# Altium footprint library Design III PCB Library.PcbLib: 98 footprints (part 6 of 7)
Each footprint in its own frame and in the unit in brackets; x right, y up, seen from the top. Pads: shape width x height; smd on the part's side, far side on the other; paste and mask are expansions set on the pad; w line width, h text height; cw(c..) or ccw(c..) is an arc to the next point about the centre after c.
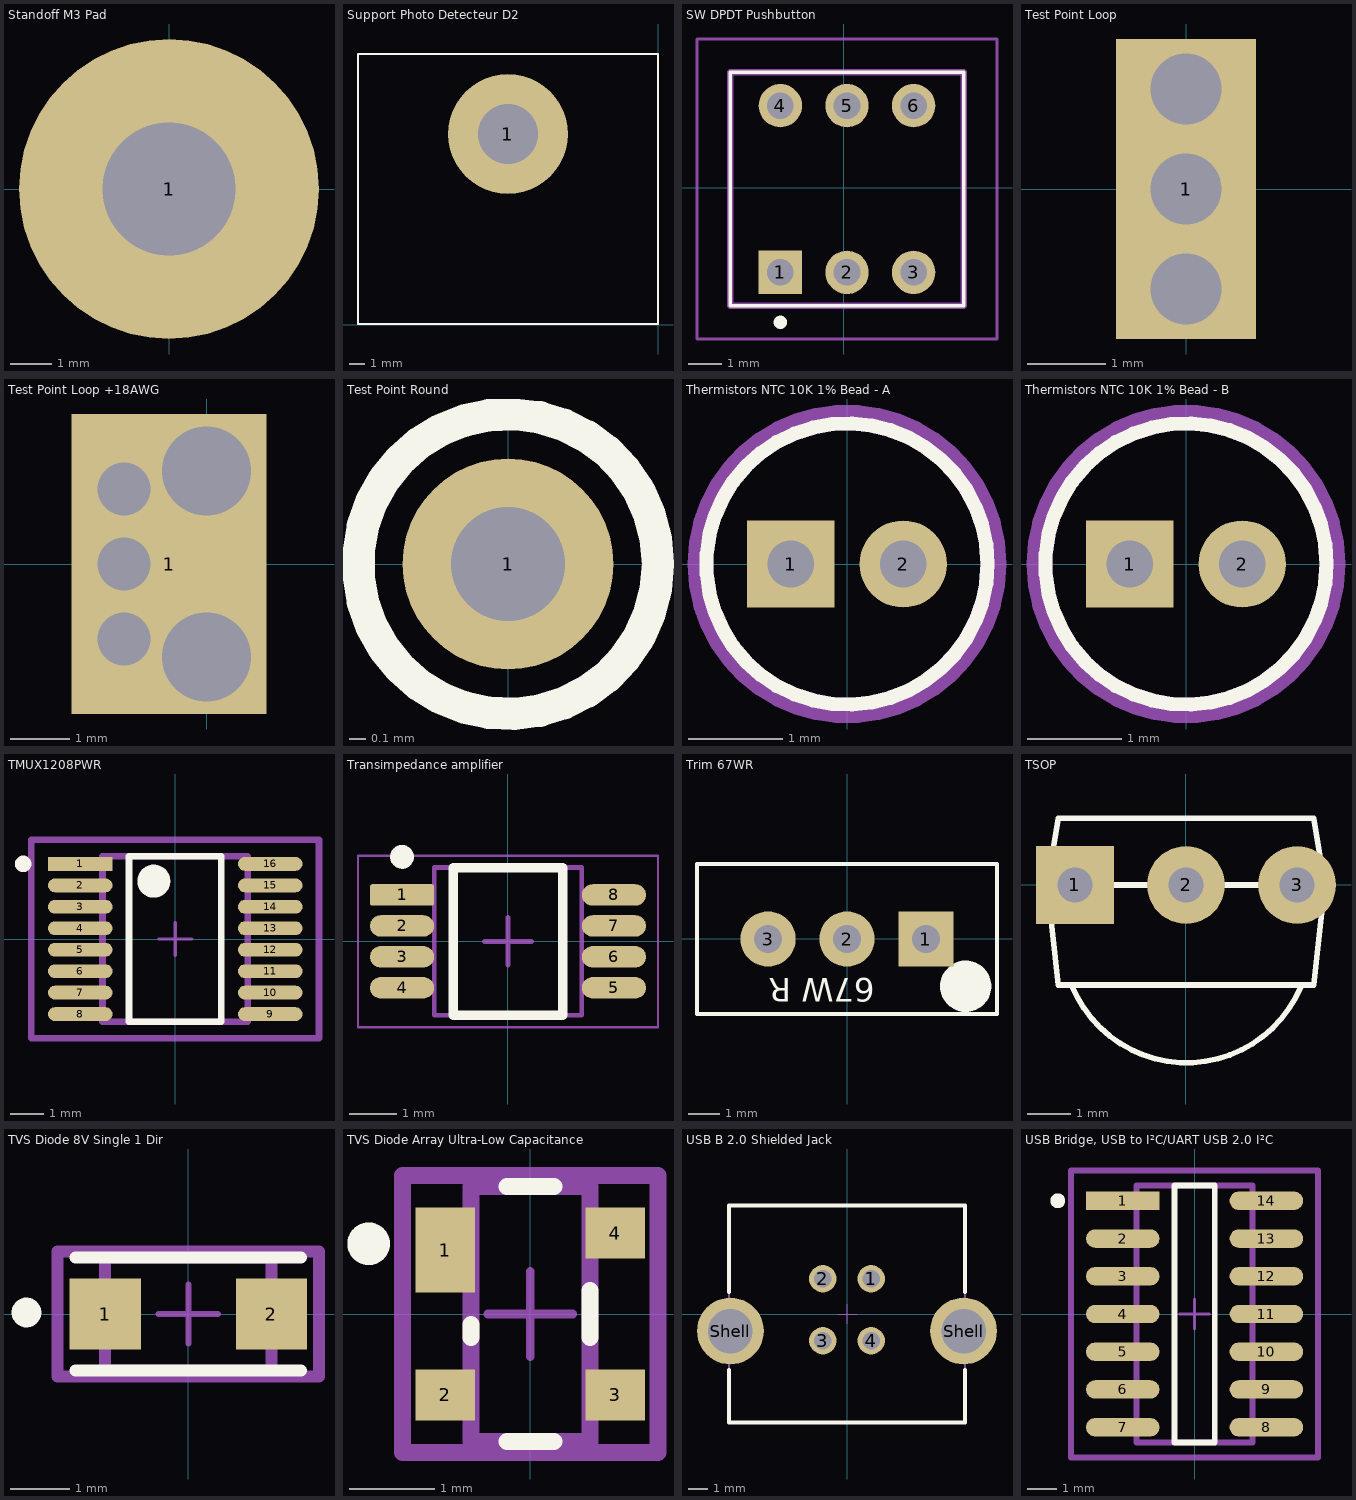
[diagram p5: the footprints below, top view; thin cyan lines are the x and y axes]

## Standoff M3 Pad [mm] "Hex Standoff Threaded M3"
pads (1):
  round 7.2 hole 3.2: 1(0,0)

## Support Photo Detecteur D2 [mm] "Support Photo Detecteur D2"
pads (1):
  round 7.62 hole 3.81: 1(-9.55,12.116)
Top Overlay:
  lines w0.127: -19.075,0.051 -0.025,0.051 -0.025,17.196 -19.075,17.196 -19.075,0.051
3D body: height 6.35, standoff 0, extent -19.075,0.051 -0.025,17.196
3D body: height 44.45, standoff 6.35, extent -19.075,0.051 -12.725,6.401
3D body: height 44.45, standoff 6.35, extent -6.375,0.051 -0.025,6.401
3D body: height 50.8, standoff 44.45, extent -19.075,0.051 -0.025,6.401
3D body: height 12.7, standoff 6.35, extent -19.075,0.051 -0.025,6.401
3D body: height 6.38, standoff -0.03, extent -10.689,10.974 -8.407,13.259

## SW DPDT Pushbutton [mm] "Pushbutton Switch DPDT Standard Through Hole"
pads (6):
  rect 1.3x1.3 hole 0.8: 1(-1.905,-2.54)
  round 1.3 hole 0.8: 2(0.095,-2.54) 3(2.095,-2.54) 4(-1.905,2.46) 5(0.095,2.46) 6(2.095,2.46)
Top Overlay:
  lines w0.1: -3.405,-3.54 3.595,-3.54 3.595,3.46 -3.405,3.46 -3.405,-3.54
  lines w0.2: -2.005,-4.04 cw(c-1.905,-4.04) -1.805,-4.04 cw(c-1.905,-4.04) -2.005,-4.04
Mechanical 13:
  lines w0.2: -3.405,-3.54 3.595,-3.54 3.595,3.46 -3.405,3.46 -3.405,-3.54
Mechanical 15:
  lines w0.1: -4.405,-4.54 4.595,-4.54 4.595,4.46 -4.405,4.46 -4.405,-4.54
3D body "TL2230xxFxxx.STEP": height 12.5, standoff -3.5, extent -3.4,-3.525 3.6,3.475

## Test Point Loop [mil] "Test Point Loop"
pads (3):
  rect 0x0 hole 35.4: 1(0,-49.83) 1(0,50.17)
  rect 70x150 hole 35.4: 1(0,0.17)
3D body: height 15, standoff -70, extent -16.99,28.18 17.01,62.18
3D body: height 15, standoff -70, extent -16.99,-61.82 17,-27.82
3D body: height 91, standoff 3, extent -17.49,-61.82 17.51,62.18

## Test Point Loop +18AWG [mil] "Test Point Loop"
pads (6):
  rect 0x0 hole 35.4: 1(-55.26,-50) 1(-55.26,50)
  round 0 hole 35.4: 1(-55.26,0)
  rect 130x200 all layers, no hole: 1(-25.26,0)
  round 0 hole 59.1: 1(-0.26,-62) 1(-0.26,62)
3D body: height 91, standoff 3, extent -72.75,-61.99 -37.75,62.01
3D body: height 15, standoff -70, extent -72.25,-61.99 -38.25,-28
3D body: height 15, standoff -70, extent -72.24,28.01 -38.25,62

## Test Point Round [mm]
pads (1):
  round 1.3 hole 0.7: 1(0,0)
Top Overlay:
  circle w0.2: c0,0 r0.925

## Thermistors NTC 10K 1% Bead - A [mm] "NTC Thermistor 10k Bead, Epoxy"
pads (2):
  rect 0.93x0.93 hole 0.5 paste-1000 mask+0: 1(-0.6,0)
  round 0.93 hole 0.5 paste-1000 mask+0: 2(0.6,0)
Top Overlay:
  circle w0.15: c0,0 r1.5
Top 3D Body:
  circle w0.15: c0,0 r1.5
Top Courtyard:
  lines w0.2: -1.6,0 ccw(c0,0) 1.6,0 ccw(c0,0) -1.6,0
3D body "NTCLE413E2 STEP214.STEP": height 1, standoff -51, extent -1.481,-1.5 1.481,1.5

## Thermistors NTC 10K 1% Bead - B [mm] "NTC Thermistor 10k Bead, Epoxy"
pads (2):
  rect 0.93x0.93 hole 0.5 paste-1000 mask+0: 1(-0.6,0)
  round 0.93 hole 0.5 paste-1000 mask+0: 2(0.6,0)
Top Overlay:
  circle w0.15: c0,0 r1.5
Top 3D Body:
  circle w0.15: c0,0 r1.5
Top Courtyard:
  lines w0.2: -1.6,0 ccw(c0,0) 1.6,0 ccw(c0,0) -1.6,0

## TMUX1208PWR [mm] "5-V, 8: 1, 1-channel general-purpose analog multiplexer with 1.8-V input logic 16-TSSOP -40 to 125"
pads (16):
  rect 1.955x0.421 smd paste+0 mask+0: 1(-2.875,2.275)
  rrect100% 1.955x0.421 smd paste+0 mask+0: 2(-2.875,1.625) 3(-2.875,0.975) 4(-2.875,0.325) 5(-2.875,-0.325) 6(-2.875,-0.975) 7(-2.875,-1.625) 8(-2.875,-2.275) 9(2.875,-2.275) 10(2.875,-1.625) 11(2.875,-0.975) 12(2.875,-0.325) 13(2.875,0.325) 14(2.875,0.975) 15(2.875,1.625) 16(2.875,2.275)
Top Overlay:
  circle w0.5: c-0.648,1.75 r0.25
  circle w0.25: c-4.603,2.275 r0.125
  lines w0.2: -1.398,-2.5 1.398,-2.5 1.398,2.5 -1.398,2.5 -1.398,-2.5
Top Assembly:
  lines w0.2: -4.353,-3 4.353,-3 4.353,3 -4.353,3 -4.353,-3
Top Courtyard:
  lines w0.2: -4.353,-3 4.353,-3 4.353,3 -4.353,3 -4.353,-3
Board:
  lines w0.2: -2.2,-2.5 2.2,-2.5 2.2,2.5 -2.2,2.5 -2.2,-2.5
Top Component Center:
  lines w0.1: -0.5,0 0.5,0 ; 0,-0.5 0,0.5
3D body "IC_TEXAS_INSTRUMENTS_SN74HC165PWR_eec.STEP": height 0.25, standoff 0, extent -4.353,-3 4.353,3

## Transimpedance amplifier [mm]
pads (8):
  rrect22% 1.35x0.45 smd: 1(-2.225,0.975)
  oval 1.35x0.45 smd: 2(-2.225,0.325) 3(-2.225,-0.325) 4(-2.225,-0.975) 5(2.225,-0.975) 6(2.225,-0.325) 7(2.225,0.325) 8(2.225,0.975)
Top Overlay:
  circle w0.25: c-2.225,1.775 r0.125
  lines w0.2: -1.15,-1.55 -1.15,1.55 1.15,1.55 1.15,-1.55 -1.15,-1.55
Mechanical 13:
  lines w0.1: -1.55,-1.55 -1.55,1.55 1.55,1.55 1.55,-1.55 -1.55,-1.55
Mechanical 15:
  lines w0.05: -3.15,-1.8 -3.15,1.8 3.15,1.8 3.15,-1.8 -3.15,-1.8
  lines w0.1: -0.5,0 0.5,0 ; 0,-0.5 0,0.5
3D body "MUY08A_ASM.stp": height 0.94, standoff -0.02, extent -2.451,-1.499 2.451,1.499

## Trim 67WR [mil] "Trim 10T Vertical"
pads (3):
  rect 70x70 hole 35.4: 1(100,-0.29)
  round 70 hole 35.4: 2(0,-0.29) 3(-100,-0.29)
Top Overlay:
  circle w35: c150.32,-60.2 r15
  lines w5: -190,-95.29 -190,94.71 190,94.71 190,-95.29 -190,-95.29
  text "67W R" at 35,-50.29 h30
3D body: height 478, standoff 450, extent 110.32,-60.21 190.32,-50.21
3D body: height 476, standoff 6, extent 111.32,-94.13 189.01,-16.28
3D body: height 417, standoff 5, extent -190,-95.29 190,94.71

## TSOP [mil] "IR Sensor"
pads (3):
  rect 70x70 hole 31.5: 1(-99.75,-0.41)
  round 70 hole 31.5: 2(0.26,-0.41) 3(100.25,-0.41)
Top Overlay:
  lines w5: -102.19,-91.42 ccw(c0.81,-49.03) 103.65,-91.83 ; -124.74,-0.41 -62.24,-0.41 62.76,-0.41 125.26,-0.41 ; -124.74,-0.41 -114.74,-90.41 115.26,-90.41 125.26,-0.41 ; -124.74,-0.41 -114.74,59.59 115.26,59.59 125.26,-0.41
3D body: height 80, standoff -20, extent 85.28,-15.29 115.22,14.59
3D body: height 80, standoff -20, extent -14.72,-15.29 15.22,14.59
3D body: height 80, standoff -20, extent -114.72,-15.29 -84.78,14.59
3D body: height 290, standoff 110, extent -89.36,-159.47 89.87,19.59
3D body: height 330, standoff 50, extent -124.74,-90.41 125.26,59.59

## TVS Diode 8V Single 1 Dir [mm] "8V Clamp 43.8A Ipp Tvs Diode Surface Mount SOD-123W"
pads (2):
  rect 1.2x1.2 smd paste-1000 mask+0: 1(-1.4,0) 2(1.4,0)
Top Overlay:
  circle w0.25: c-2.725,0.025 r0.125
  lines w0.2: -1.9,-0.95 1.9,-0.95 ; -1.9,0.95 1.9,0.95
Top Paste:
  rectangle: -1.95,-0.55 -0.85,0.55
  rectangle: 0.85,-0.55 1.95,0.55
Top Assembly:
  lines w0.2: -2.2,-1.05 2.2,-1.05 2.2,1.05 -2.2,1.05 -2.2,-1.05
Top Courtyard:
  lines w0.2: -2.2,-1.05 2.2,-1.05 2.2,1.05 -2.2,1.05 -2.2,-1.05
Board:
  lines w0.2: -1.4,-0.95 1.4,-0.95 1.4,0.95 -1.4,0.95 -1.4,-0.95
Top Component Center:
  lines w0.1: -0.5,0 0.5,0 ; 0,-0.5 0,0.5
3D body "Diode_Nexperia_PTVS7V0S1UR_115_eec.STEP": height 0.25, standoff 0, extent -2.2,-1.05 2.2,1.05

## TVS Diode Array Ultra-Low Capacitance [mm] "Clamp Ipp Tvs Diode Surface Mount SOT-143B"
pads (4):
  rect 0.7x1 smd paste-1000 mask+0: 1(-1,0.75)
  rect 0.7x0.6 smd paste-1000 mask+0: 2(-1,-0.95) 3(1,-0.95) 4(1,0.95)
Top Overlay:
  circle w0.25: c-1.9,0.825 r0.125
  lines w0.2: -0.7,-0.275 -0.7,-0.125 ; -0.275,-1.5 0.275,-1.5 ; -0.275,1.5 0.275,1.5 ; 0.7,-0.275 0.7,0.275
Top Paste:
  rectangle: 0.7,0.7 1.3,1.2
  rectangle: 0.7,-1.2 1.3,-0.7
  rectangle: -1.3,-1.2 -0.7,-0.7
  rectangle: -1.3,0.3 -0.7,1.2
Top Assembly:
  lines w0.2: -1.5,-1.625 -1.5,1.625 1.5,1.625 1.5,-1.625 -1.5,-1.625
Top Courtyard:
  lines w0.2: -1.5,-1.625 -1.5,1.625 1.5,1.625 1.5,-1.625 -1.5,-1.625
Board:
  lines w0.2: -0.7,-1.5 -0.7,1.5 0.7,1.5 0.7,-1.5 -0.7,-1.5
Top Component Center:
  lines w0.1: -0.5,0 0.5,0 ; 0,-0.5 0,0.5
3D body "Trans_Nexperia_BCM62B_215_eec.STEP": height 0.25, standoff 0, extent -1.5,-1.625 1.5,1.625

## USB B 2.0 Shielded Jack [mm] "Straight PCB Mount Mount Female Type B USB Connector; 30 V ac; 1.5A"
pads (6):
  round 1.42 hole 0.92: 1(1.25,1.82) 2(-1.25,1.82) 3(-1.25,-1.38) 4(1.25,-1.38)
  round 3.45 hole 2.3: Shell(-6.02,-0.88) Shell(6.02,-0.88)
Top Overlay:
  lines w0.2: -6.1,-2.9 -6.1,-5.6 6.1,-5.6 6.1,-2.9 ; -6.1,1.14 -6.1,5.6 6.1,5.6 6.1,1.14
Mechanical 13:
  lines w0.1: -6.1,-5.6 6.1,-5.6 6.1,5.6 -6.1,5.6 -6.1,-5.6
Mechanical 15:
  lines w0.05: -0.5,0 0.5,0 ; 0,-0.5 0,0.5
3D body "61400413321.stp": height 16.14, standoff -4.18, extent -7.35,-5.6 7.35,5.6

## USB Bridge, USB to I²C/UART USB 2.0 I²C [mm] "USB Bridge, USB to I²C/UART USB 2.0 I²C, UART Interface 14-SOIC"
pads (14):
  rect 2.474x0.622 smd paste+0 mask+0: 1(-2.416,3.81)
  rrect100% 2.474x0.622 smd paste+0 mask+0: 2(-2.416,2.54) 3(-2.416,1.27) 4(-2.416,0) 5(-2.416,-1.27) 6(-2.416,-2.54) 7(-2.416,-3.81) 8(2.416,-3.81) 9(2.416,-2.54) 10(2.416,-1.27) 11(2.416,0) 12(2.416,1.27) 13(2.416,2.54) 14(2.416,3.81)
Top Overlay:
  circle w0.25: c-4.603,3.81 r0.125
  lines w0.2: -0.679,-4.325 -0.679,4.325 0.679,4.325 0.679,-4.325 -0.679,-4.325
Top Assembly:
  lines w0.2: -4.153,-4.825 -4.153,4.825 4.153,4.825 4.153,-4.825 -4.153,-4.825
Top Courtyard:
  lines w0.2: -4.153,-4.825 -4.153,4.825 4.153,4.825 4.153,-4.825 -4.153,-4.825
Board:
  lines w0.2: -1.95,-4.325 -1.95,4.325 1.95,4.325 1.95,-4.325 -1.95,-4.325
Top Component Center:
  lines w0.1: -0.5,0 0.5,0 ; 0,-0.5 0,0.5
3D body "IC_Microchip_MCP2221A-I-SL_eec.STEP": height 0.25, standoff 0, extent -4.153,-4.825 4.153,4.825